# Altium footprint library TarabusLibrary.PcbLib: 591 footprints (part 5 of 37)
Each footprint in its own frame and in the unit in brackets; x right, y up, seen from the top. Pads: shape width x height; smd on the part's side, far side on the other; paste and mask are expansions set on the pad; w line width, h text height; cw(c..) or ccw(c..) is an arc to the next point about the centre after c.
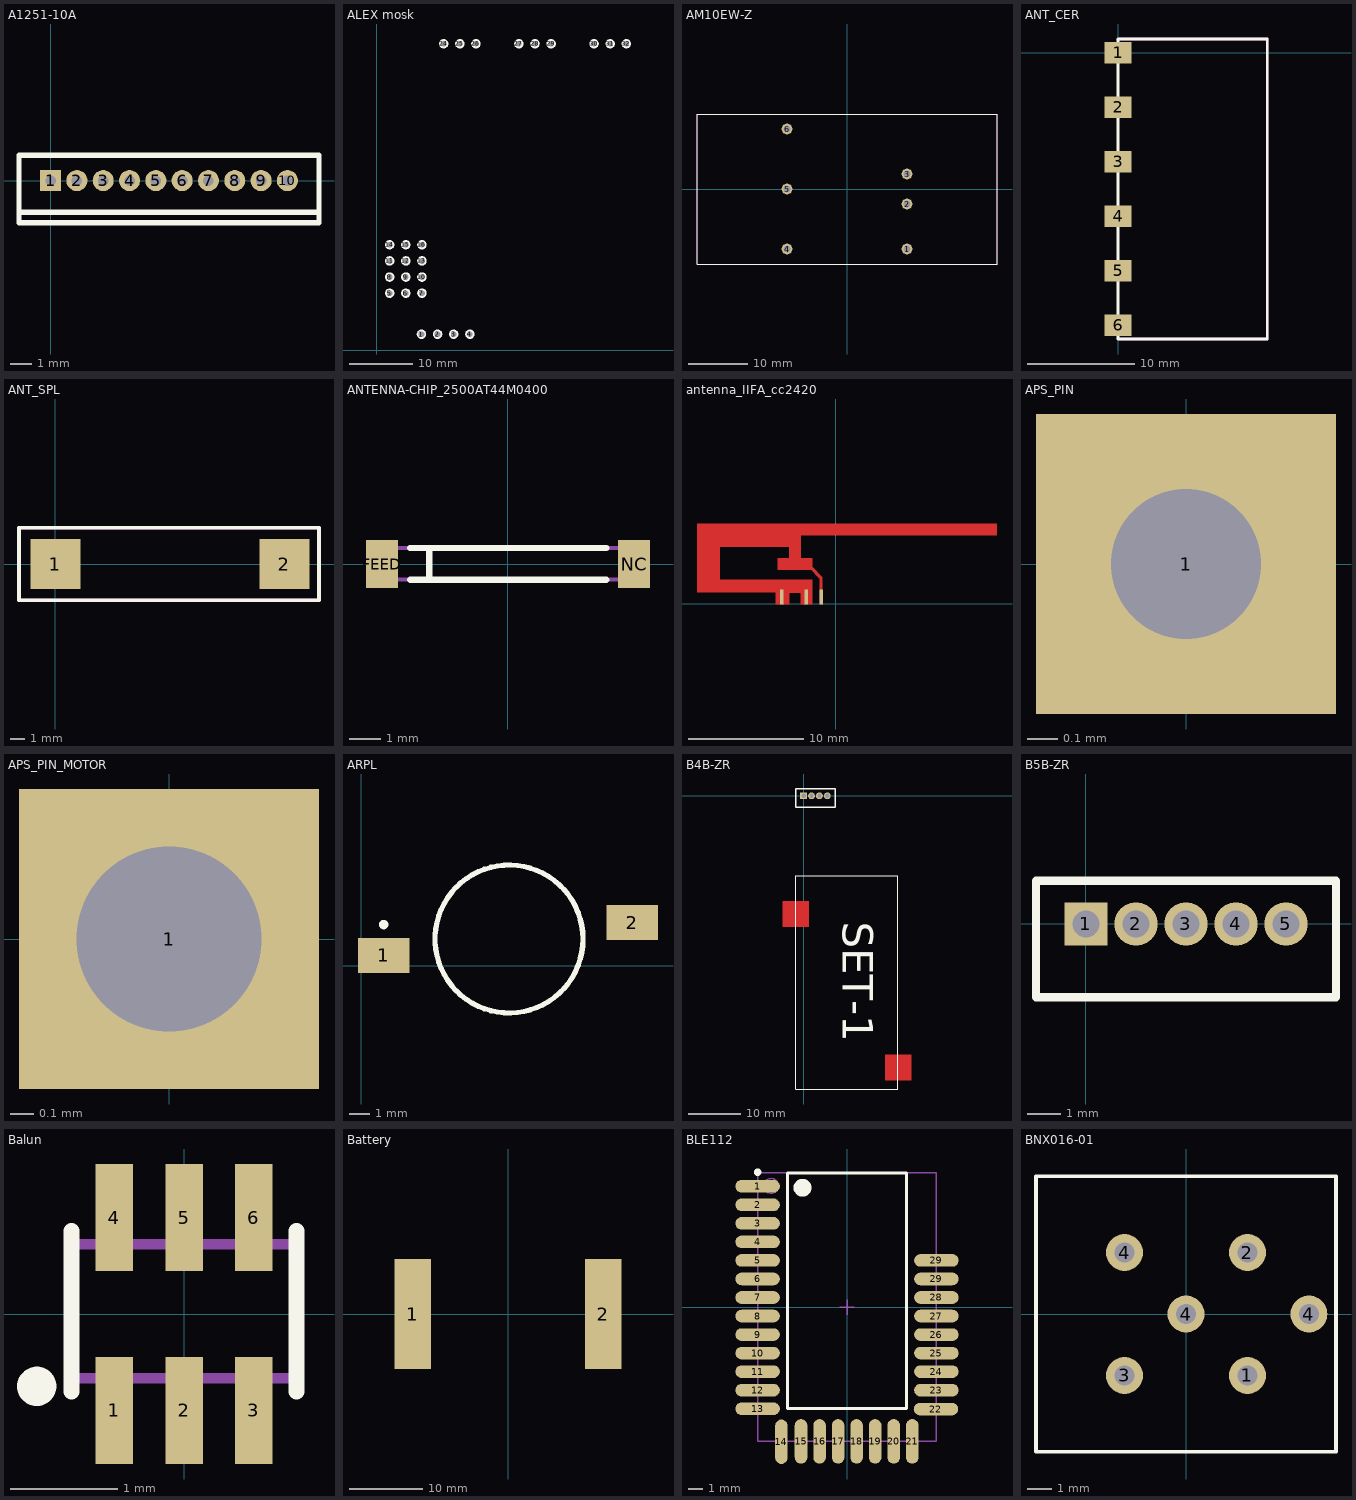
[diagram p4: the footprints below, top view; thin cyan lines are the x and y axes]

## A1251-10A [mm]
pads (10):
  rect 1x1 hole 0.5 mask+0: 1(0,0)
  round 1 hole 0.5 mask+0: 2(1.25,0) 3(2.5,0) 4(3.75,0) 5(5,0) 6(6.25,0) 7(7.5,0) 8(8.75,0) 9(10,0) 10(11.25,0)
Top Overlay:
  lines w0.254: -1.5,-1.5 12.75,-1.5 ; -1.5,-2 -1.5,1.2 12.75,1.2 12.75,-2 -1.5,-2
3D body "530471010.stp": height 4.1, standoff -2.3, extent -1.525,-2 12.725,1.2

## ALEX mosk [mm]
pads (25):
  round 1.5 on Top Overlay hole 0.9 unplated mask+0.1: 1(7,2.54) 2(9.54,2.54) 3(12.08,2.54) 4(14.62,2.54) 5(2,9) 6(4.54,9) 7(7.08,9) 8(2,11.54) 9(4.54,11.54) 10(7.08,11.54) 11(2,14.08) 12(4.54,14.08) 13(7.08,14.08) 14(2,16.62) 15(4.54,16.62) 16(7.08,16.62) 24(10.5,48.25) 25(13.04,48.25) 26(15.58,48.25) 27(22.33,48.25) 28(24.87,48.25) 29(27.41,48.25) 30(34.16,48.25) 31(36.7,48.25) 32(39.24,48.25)
3D body "Контроллер2.STEP": height -0.95, standoff -11.75, extent -38,-1.5 50.4,51.6

## AM10EW-Z [mm]
pads (6):
  round 1.8 hole 1.2: 1(10.16,-10.16) 2(10.16,-2.54) 3(10.16,2.54) 4(-10.16,-10.16) 5(-10.16,0) 6(-10.16,10.16)
Top Overlay:
  lines w0.15: -25.4,-12.7 -25.4,12.7 25.4,12.7 25.4,-12.7 -25.4,-12.7
Mechanical 7:
  lines w0.1: -25.4,-12.7 25.4,-12.7 25.4,12.7 -25.4,12.7 -25.4,-12.7
  text ".Designator" at -0.21,1.63 h0.8

## ANT_CER [mm]
pads (6):
  rect 2.5x2 smd: 1(0,0) 2(0,-5.1) 3(0,-10.2) 4(0,-15.3) 5(0,-20.4) 6(0,-25.5)
Top Overlay:
  lines w0.254: 0,-26.77 13.97,-26.77 13.97,1.297 0,1.297 0,-26.77
Mechanical 7:
  lines w0.254: 0,-26.77 13.97,-26.77 13.97,1.297 0,1.297

## ANT_SPL [mm]
pads (2):
  rect 3.5x3.5 smd: 1(0,0) 2(16,0)
Top Overlay:
  lines w0.254: -2.54,-2.54 18.415,-2.54 18.415,2.54 -2.54,2.54 -2.54,-2.54
Mechanical 7:
  lines w0.254: -2.54,-2.54 18.415,-2.54 18.415,2.54 -2.54,2.54 -2.54,-2.54

## ANTENNA-CHIP_2500AT44M0400 [mil] "ANTENNA-CHIP_2500AT44M0400"
pads (2):
  rect 40x60 smd: FEED(-157.48,0) NC(158,0)
Top Overlay:
  lines w8: -122.05,-19.68 -98.43,-19.68 ; -122.05,20 -98.43,20 ; 123,-19.68 -98.43,-19.68 ; 123,20 -98.43,20 ; -98.43,-19.68 -98.43,20
Mechanical 2:
  text ">NAME" at -130,40 h24.8
Mechanical 4:
  text ">VALUE" at -130,-60 h24.8
Mechanical 16:
  lines w5: -98.43,-19.68 -98.43,20 ; -98.43,-19.68 -157.48,-19.68 -157.48,20 -98.43,20 ; -98.43,-19.68 158,-19.68 158,20 -98.43,20

## antenna_IIFA_cc2420 [mm]
pads (3):
  rect 0.3x1.3 smd paste-0.3 mask-0.3: 1(-1.27,0.584) 2(-2.565,0.584) 3(-4.674,0.584)
Top Layer:
  region: -1.397,2.134 -1.422,2.21 -2.261,3.048 -2.032,3.175 -1.143,2.286 -1.143,2.134
  region: -1.143,-0.076 -1.397,-0.076 -1.397,2.147 -1.143,2.147
  region: -2.03,-0.076 -3.03,-0.076 -3.03,0.924 -4.03,0.924 -4.03,-0.076 -5.18,-0.076 -5.18,0.991 -12.012,0.991 -12.012,6.924 13.97,6.924 13.97,5.924 -3.03,5.924 -3.03,3.924 -2.03,3.924 -2.03,2.924 -5.03,2.924 -5.03,3.924 -4.03,3.924 -4.03,4.924 -10.03,4.924 -10.03,2.057 -2.03,2.057

## APS_PIN [mm]
pads (1):
  rect 1x1 hole 0.5 mask+0: 1(0,0)

## APS_PIN_MOTOR [mm]
pads (1):
  rect 1.3x1.3 hole 0.8 mask+0: 1(0,0)

## ARPL [mm]
pads (2):
  rect 2.5x1.7 smd: 1(1.1,0.5) 2(13.2,2.1)
Top Overlay:
  circle w0.254: c7.2,1.3 r3.6
  circle w0.254: c1.1,2 r0.1

## B4B-ZR [mm]
pads (4):
  rect 1.3x1.3 hole 0.8 mask+0: 1(0,0)
  round 1.3 hole 0.8 mask+0: 2(1.5,0) 3(3,0) 4(4.5,0)
Top Layer:
  rectangle: -4,-25 1,-20
  rectangle: 15.5,-54.2 20.5,-49.2
Top Overlay:
  lines w0.15: -1.5,-55.8 17.9,-55.8 17.9,-15.2 -1.5,-15.2 -1.5,-55.8
  lines w0.254: -1.5,-2.2 6,-2.2 6,1.3 -1.5,1.3 -1.5,-2.2
  text "SET-1" at 5.5,-24 h10
3D body "4pin.STEP": height 4.5, standoff -2.7, extent -1.55,-2.15 5.95,1.35
3D body "BПЧ051 Rev.2.stp": height 5.9, standoff 0, extent -1.5,-55.8 17.9,-15.2

## B5B-ZR [mm]
pads (5):
  rect 1.3x1.3 hole 0.8 mask+0: 1(0,0)
  round 1.3 hole 0.8 mask+0: 2(1.5,0) 3(3,0) 4(4.5,0) 5(6,0)
Top Overlay:
  lines w0.254: -1.5,-2.2 7.5,-2.2 7.5,1.3 -1.5,1.3 -1.5,-2.2
3D body "5pin.STEP": height 4.5, standoff -2.7, extent -1.5,-2.15 7.5,1.35

## Balun [mm]
height 0.7
pads (6):
  rect 0.35x1 smd: 1(-0.65,-0.9) 2(0,-0.9) 3(0.65,-0.9) 4(-0.65,0.9) 5(0,0.9) 6(0.65,0.9)
Top Overlay:
  circle w0.254: c-1.375,-0.675 r0.056
  lines w0.15: -1.05,-0.725 -1.05,0.775 ; 1.05,-0.725 1.05,0.775
Mechanical 7:
  lines w0.1: -1.05,-0.6 -1.05,0.65 1.05,0.65 1.05,-0.6 -1.05,-0.6
Mechanical 10:
  text ".Comment" at -0.925,-2.05 h0.6
  text ".Designator" at -1.8,1.775 h0.8
3D body: height 0.55, standoff 0, extent -1.05,-0.6 1.05,0.65

## Battery [mm]
pads (2):
  rect 5x15 smd mask+0: 1(-13,0) 2(13,0)

## BLE112 [mm] "Module,28-Leads, Body 18,10x8,66mm, Pitch 1,25mm"
height 2.3
pads (30):
  oval 3x0.85 smd: 1(-6.025,8.15) 2(-6.025,6.9) 3(-6.025,5.65) 4(-6.025,4.4) 5(-6.025,3.15) 6(-6.025,1.9) 7(-6.025,0.65) 8(-6.025,-0.6) 9(-6.025,-1.85) 10(-6.025,-3.1) 11(-6.025,-4.35) 12(-6.025,-5.6) 13(-6.025,-6.85) 22(6,-6.875) 23(6.025,-5.6) 24(6.025,-4.35) 25(6.025,-3.1) 26(6.025,-1.85) 27(6.025,-0.6) 28(6.025,0.65) 29(6.025,1.9) 29(6.025,3.15)
  oval 0.85x3 smd: 14(-4.425,-9.075) 15(-3.1,-9.05) 16(-1.85,-9.05) 17(-0.6,-9.05) 18(0.65,-9.05) 19(1.9,-9.05) 20(3.15,-9.05) 21(4.4,-9.05)
Top Overlay:
  circle w0.25: c-6.025,9.1 r0.125
  circle w0.6: c-3,8.05 r0.3
  lines w0.2: -4,-6.825 -4,9.05 4,9.05 4,-6.825 -4,-6.825
Mechanical 7:
  lines w0.05: -6.025,-9.05 -6.025,9.05 6.025,9.05 6.025,-9.05 -6.025,-9.05
  lines w0.1: -0.5,0 0.5,0 ; 0,-0.5 0,0.5
Mechanical 9:
  circle w0.1: c-5.125,8.175 r0.5
  lines w0.1: -6.025,-9.05 -6.025,9.05 6.025,9.05 6.025,-9.05 -6.025,-9.05
3D body: height 2.3, standoff 0, extent -6.025,-9.05 6.025,9.05

## BNX016-01 [mm] "12x11x8"
height 8
pads (6):
  round 1.5 hole 0.8: 1(2.5,-2.5) 2(2.5,2.5) 3(-2.5,-2.5) 4(-2.5,2.5) 4(0,0) 4(5,0)
Top Overlay:
  lines w0.15: -6.1,-5.6 -6.1,5.6 6.1,5.6 6.1,-5.6 -6.1,-5.6
Mechanical 7:
  lines w0.1: -6.1,-5.6 6.1,-5.6 6.1,5.6 -6.1,5.6 -6.1,-5.6
3D body: height 2, standoff -2, extent -2.75,-2.8 -2.225,-2.2
3D body: height 2, standoff -2, extent 2.25,-2.8 2.775,-2.2
3D body: height 2, standoff -2, extent 4.75,-0.3 5.275,0.3
3D body: height 2, standoff -2, extent -0.25,-0.3 0.275,0.3
3D body: height 2, standoff -2, extent -2.75,2.2 -2.225,2.8
3D body: height 2, standoff -2, extent 2.25,2.2 2.775,2.8
3D body: height 8, standoff 0, extent -6,-5.5 6,5.5